# Altium footprint library CM3Board.PcbLib: 127 footprints (part 8 of 8)
Each footprint in its own frame and in the unit in brackets; x right, y up, seen from the top. Pads: shape width x height; smd on the part's side, far side on the other; paste and mask are expansions set on the pad; w line width, h text height; cw(c..) or ccw(c..) is an arc to the next point about the centre after c.
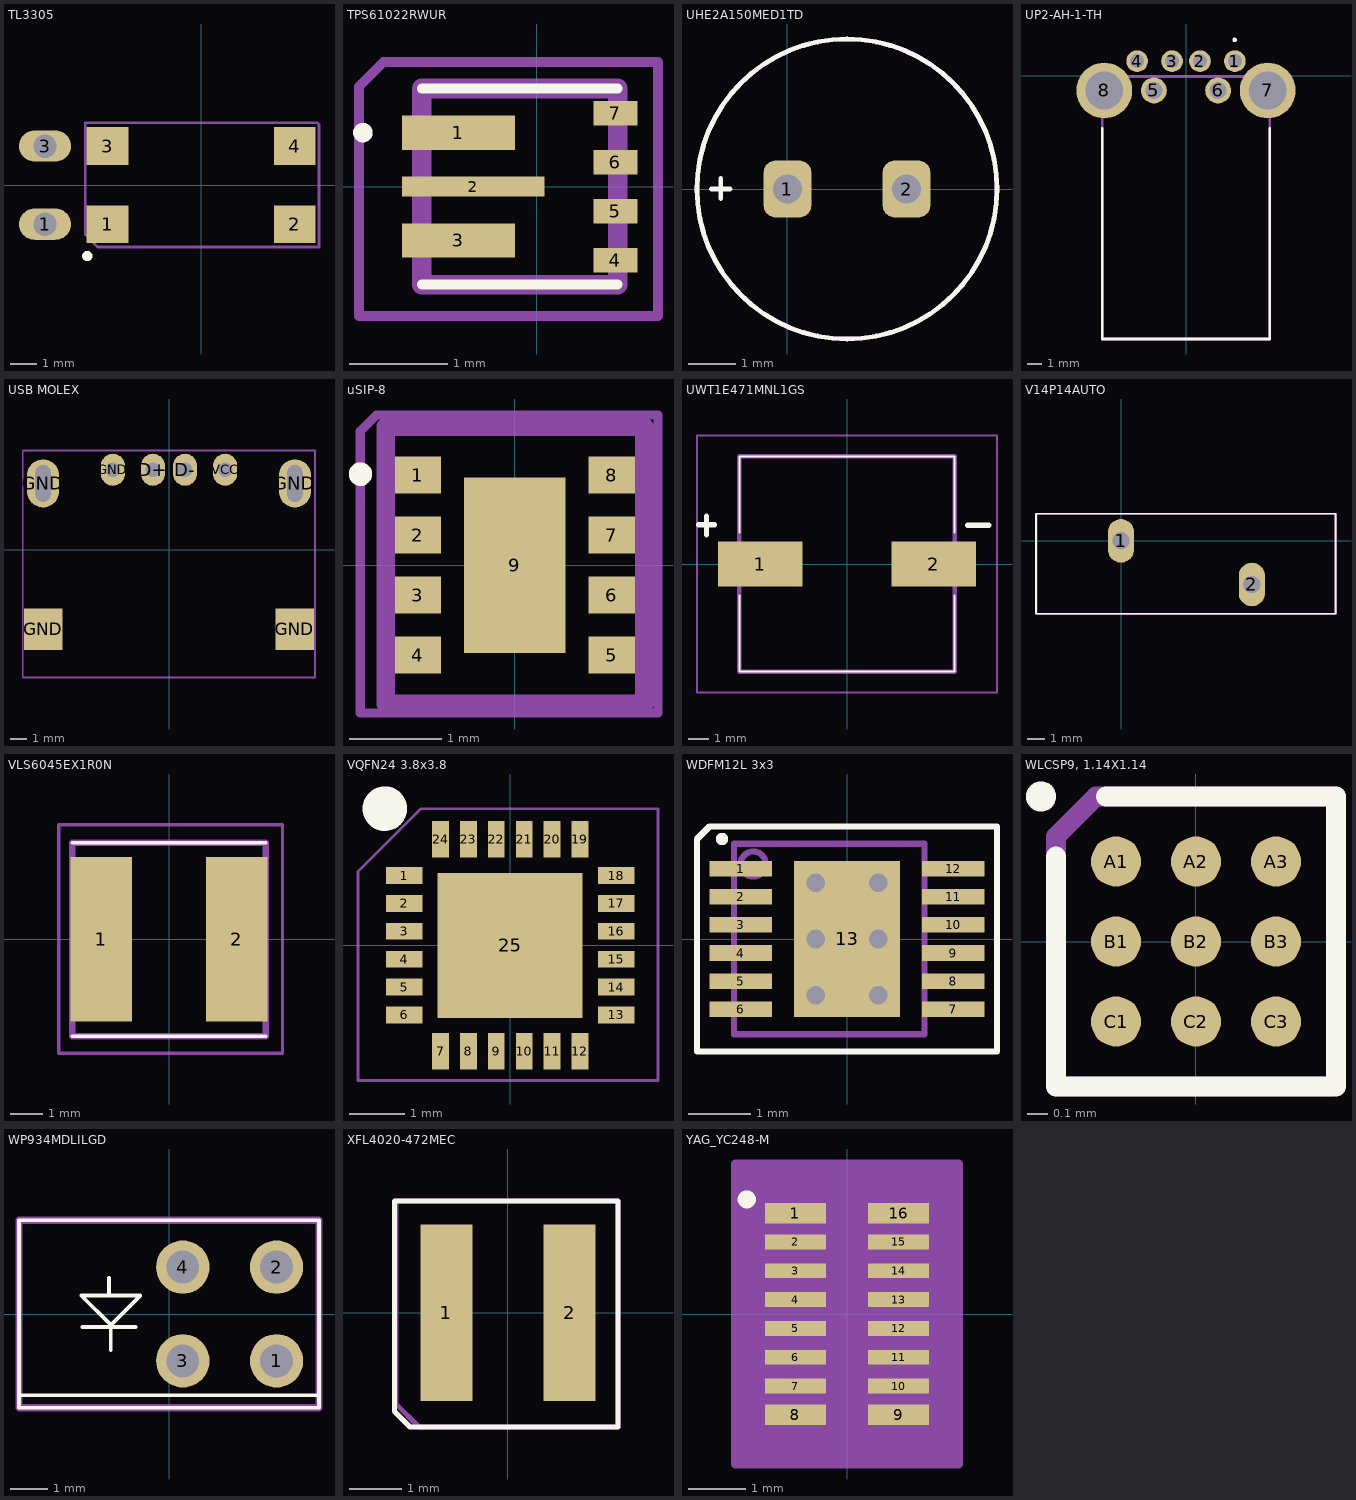
[diagram p7: the footprints below, top view; thin cyan lines are the x and y axes]

## TL3305 [mm] "SWITCH"
pads (6):
  oval 2x1.2 hole 0.9: 1(-6,-1.5) 3(-6,1.5)
  rect 1.6x1.45 smd: 1(-3.6,-1.5) 2(3.6,-1.5) 3(-3.6,1.5) 4(3.6,1.5)
Top Overlay:
  circle w0.254: c-4.375,-2.725 r0.071
Mechanical 29:
  lines w0.1: -4.45,-1.9 -4.45,2.4 4.45,2.4 4.525,2.325 4.525,-2.375 -3.975,-2.375 -4.45,-1.9
  text ".Designator" at -3.1,-0.425 h1.52
3D body: height 10, standoff 7, extent -1.519,-1.344 1.469,1.65
3D body: height 7, standoff 0, extent -3.725,-2.093 3.825,2.144

## TPS61022RWUR [mm]
pads (7):
  rect 1.15x0.35 smd: 1(-0.8,0.55) 3(-0.8,-0.55)
  rect 1.45x0.2 smd: 2(-0.65,0)
  rect 0.45x0.25 smd: 4(0.8,-0.75) 5(0.8,-0.25) 6(0.8,0.25) 7(0.8,0.75)
Top Overlay:
  lines w0.1: -1.175,-1 0.825,-1 ; -1.175,1 0.825,1 ; -1.775,0.5 cw(c-1.775,0.55) -1.775,0.6 cw(c-1.775,0.55) -1.775,0.5
Mechanical 13:
  lines w0.2: -1.175,-1 0.825,-1 0.825,1 -1.175,1 -1.175,-1
Mechanical 29:
  lines w0.1: -1.815,-1.32 -1.815,1.02 -1.565,1.27 1.235,1.27 1.235,-1.32 -1.815,-1.32
  text ".Designator" at 0.575,-1.24 h1
3D body "TPS61022RWUR.stp": height 1.1, standoff 0, extent -1.355,-1 1,1

## UHE2A150MED1TD [mm] "D=6.3"
pads (2):
  rrect50% 1x1.2 hole 0.6: 1(0,0) 2(2.5,0)
Top Overlay:
  circle w0.1: c1.25,0 r3.15
  lines w0.1: -1.6,0 -1.2,0 ; -1.4,-0.2 -1.4,0.225
Mechanical 29:
  circle w0.1: c1.25,0 r3.15
  text ".Designator" at 0.025,-0.4 h1
3D body: height 11, standoff 0, extent -1.925,-3.122 4.375,3.172

## UP2-AH-1-TH [mm]
pads (8):
  round 1.55 hole 1: 1(3.5,1.05) 2(1,1.05) 3(-1,1.05) 4(-3.5,1.05)
  round 1.85 hole 1.2: 5(-2.3,-1.05) 6(2.3,-1.05)
  round 4 hole 2.7: 7(5.85,-1.05) 8(-5.85,-1.05)
Top Overlay:
  circle w0.2: c3.483,2.572 r0.064
  lines w0.2: -6,-3.764 -6,-18.85 6,-18.85 6,-3.764
Mechanical 13:
  lines w0.2: -6,-18.85 -6,-0.05 6,-0.05 6,-18.85 -6,-18.85
Mechanical 29:
  text ".Designator" at -2.09,-11.02 h1
3D body "UP2-AH-1-TH.stp": height 4.15, standoff -2.2, extent -6.3,-18.83 6.3,1.17

## USB MOLEX [mm] "0482580002"
pads (8):
  oval 1.5x2 hole 0.92: D+(-1,4.975) D-(1,4.975) GND(-3.5,4.975) VCC(3.5,4.975)
  rect 2.4x2.6 smd: GND(-7.85,-4.975) GND(7.85,-4.975)
  oval 2x3 hole 0.95 slot 2.3 at 90 deg: GND(-7.85,4.125) GND(7.85,4.125)
Mechanical 29:
  lines w0.1: -9.125,-7.975 -9.125,6.175 9.1,6.175 9.1,-7.975 -9.125,-7.975
  text ".Designator" at -7.3,-5.3 h1.52
3D body "482580002.stp": height 4.27, standoff -2.63, extent -8.55,-8.025 8.55,5.975

## uSIP-8 [mm]
pads (9):
  rect 0.5x0.4 smd: 1(-1.05,0.975) 2(-1.05,0.325) 3(-1.05,-0.325) 4(-1.05,-0.975) 5(1.05,-0.975) 6(1.05,-0.325) 7(1.05,0.325) 8(1.05,0.975)
  rect 1.1x1.9 smd: 9(0,0)
Top Overlay:
  circle w0.2: c-1.672,0.986 r0.027
Mechanical 15:
  lines w0.2: -1.4,-1.5 1.4,-1.5 1.4,1.5 -1.4,1.5 -1.4,-1.5
Mechanical 29:
  lines w0.1: -1.675,-1.6 1.55,-1.6 1.55,1.625 -1.5,1.625 -1.675,1.45 -1.675,-1.6
  text ".Designator" at -0.525,-0.35 h1
3D body "TPS82084SILT.step": height 1.33, standoff 0, extent -1.4,-1.525 1.4,1.475

## UWT1E471MNL1GS [mm]
pads (2):
  rect 4.05x2.15 smd: 1(-4.15,0) 2(4.15,0)
Top Overlay:
  lines w0.1: -5.15,-1.5 -5.15,-5.15 5.15,-5.15 5.15,-1.5 ; -5.15,1.5 -5.15,5.15 5.15,5.15 5.15,1.5
  lines w0.254: -7.1,1.875 -6.35,1.875 ; -6.725,1.4 -6.725,2.3 ; 5.775,1.85 6.775,1.85
Mechanical 13:
  lines w0.2: -5.15,-5.15 -5.15,5.15 5.15,5.15 5.15,-5.15 -5.15,-5.15
Mechanical 29:
  lines w0.1: -7.175,-6.15 7.175,-6.15 7.175,6.15 -7.175,6.15 -7.175,-6.15
  text ".Designator" at -0.55,-0.675 h1

## V14P14AUTO [mm]
pads (2):
  oval 1.5x2.5 hole 1: 1(0,0) 2(7.5,-2.5)
Top Overlay:
  lines w0.1: -4.875,-4.175 -3.5,-4.175 12.3,-4.175 12.3,1.55 -4.875,1.55 -4.875,-4.15
Mechanical 29:
  lines w0.1: -4.85,-4.2 -4.85,1.55 12.325,1.55 12.325,-4.2 -4.85,-4.2
  text ".Designator" at -2.2,-2.1 h1.52
3D body "Varistor 14mm.step": height 18.5, standoff -4.5, extent -4.775,-4.125 12.225,1.475

## VLS6045EX1R0N [mm]
pads (2):
  rect 1.9x5.1 smd: 1(-2.1,0) 2(2.1,0)
Top Overlay:
  lines w0.1: -3,-3 3,-3 ; -3,3 3,3
Mechanical 13:
  lines w0.2: -3,-3 -3,3 3,3 3,-3 -3,-3
Mechanical 29:
  lines w0.1: -3.42,-3.53 -3.42,3.56 3.52,3.56 3.52,-3.53 -3.42,-3.53
  text ".Designator" at -2.98,-0.58 h1
3D body "VLS6045EX-1R0N.stp": height 4.6, standoff 0, extent -2.92,-2.91 3.08,3.09

## VQFN24 3.8x3.8 [mm]
pads (25):
  rect 0.65x0.3 smd: 1(-1.9,1.25) 2(-1.9,0.75) 3(-1.9,0.25) 4(-1.9,-0.25) 5(-1.9,-0.75) 6(-1.9,-1.25) 13(1.9,-1.25) 14(1.9,-0.75) 15(1.9,-0.25) 16(1.9,0.25) 17(1.9,0.75) 18(1.9,1.25)
  rect 0.3x0.65 smd: 7(-1.25,-1.9) 8(-0.75,-1.9) 9(-0.25,-1.9) 10(0.25,-1.9) 11(0.75,-1.9) 12(1.25,-1.9) 19(1.25,1.9) 20(0.75,1.9) 21(0.25,1.9) 22(-0.25,1.9) 23(-0.75,1.9) 24(-1.25,1.9)
  rect 2.6x2.6 smd: 25(0,0)
Top Overlay:
  circle w0.4: c-2.25,2.45 r0.2
Mechanical 29:
  lines w0.05: -2.73,-2.425 2.65,-2.425 2.65,2.45 -1.6,2.45 -2.73,1.32 -2.73,-2.425
  text ".Designator" at -2.58,-0.69 h1
3D body "User Library-QFN 24 4x4.step": height 0.9, standoff 0, extent -2.004,-2.002 2,2.002

## WDFM12L 3x3 [mm]
height 0.8
pads (13):
  rect 1x0.25 smd: 1(-1.7,1.125) 2(-1.7,0.675) 3(-1.7,0.225) 4(-1.7,-0.225) 5(-1.7,-0.675) 6(-1.7,-1.125) 7(1.7,-1.125) 8(1.7,-0.675) 9(1.7,-0.225) 10(1.7,0.225) 11(1.7,0.675) 12(1.7,1.125)
  rect 1.7x2.5 smd: 13(0,0)
via 0.5,-0.9 diameter 0.5 hole 0.3
via -0.5,-0.9 diameter 0.5 hole 0.3
via -0.5,0 diameter 0.5 hole 0.3
via 0.5,0 diameter 0.5 hole 0.3
via 0.5,0.9 diameter 0.5 hole 0.3
via -0.5,0.9 diameter 0.5 hole 0.3
Top Overlay:
  circle w0.1: c-2,1.6 r0.05
  lines w0.1: -2.4,-1.8 2.4,-1.8 2.4,1.8 1.4,1.8 -1.8,1.8 -2.2,1.8 -2.4,1.6 -2.4,-1.8
Mechanical 15:
  lines w0.1: -0.785,0 0.215,0 ; -0.285,-0.5 -0.285,0.5
Mechanical 29:
  circle w0.1: c-1.5,1.2 r0.2
  lines w0.1: -1.81,-1.525 1.24,-1.525 1.24,1.525 -1.81,1.525 -1.81,-1.525
  text ".Designator" at -1.5,-0.7 h1
3D body: height 0.8, standoff 0.05, extent -1.7,-1.45 1.8,1.6

## WLCSP9, 1.14X1.14 [mm]
pads (9):
  round 0.25 smd: A1(-0.4,0.4) A2(0,0.4) A3(0.4,0.4) B1(-0.4,0) B2(0,0) B3(0.4,0) C1(-0.4,-0.4) C2(0,-0.4) C3(0.4,-0.4)
Top Overlay:
  circle w0.1: c-0.775,0.725 r0.025
  lines w0.1: -0.7,0.425 -0.7,-0.725 0.7,-0.725 0.7,0.725 -0.45,0.725
Mechanical 29:
  lines w0.1: -0.7,-0.725 0.675,-0.725 0.7,-0.7 0.7,0.725 -0.5,0.725 -0.7,0.525 -0.7,-0.725
  text ".Designator" at -1,-0.5 h1
3D body: height 0.63, standoff 0.05, extent -0.625,-0.625 0.625,0.625

## WP934MDLILGD [mm]
pads (4):
  round 1.445 hole 0.889: 1(2.915,-1.27) 2(2.915,1.27) 3(0.375,-1.27) 4(0.375,1.27)
Top Overlay:
  lines w0.1: -4.04,-2.2 -3.825,-2.2 4.025,-2.2 ; -2.35,-0.35 -0.9,-0.35 ; -1.65,0.5 -2.375,0.5 -1.575,-0.3 ; -1.625,0.981 -1.625,0.5 -0.775,0.5 -1.575,-0.3 ; -1.575,-0.975 -1.575,-0.3 ; -4.065,-2.54 -4.065,2.54 4.065,2.54 4.065,-2.54 -4.065,-2.54
Mechanical 29:
  lines w0.2: -4.065,-2.54 4.065,-2.54 4.065,2.54 -4.065,2.54 -4.065,-2.54
  text ".Designator" at -0.635,-0.381 h1
3D body "WP934MD_LILGD.stp": height 9, standoff -5, extent -4.065,-2.54 4.065,2.54

## XFL4020-472MEC [mm]
pads (2):
  rect 1x3.4 smd: 1(-1.185,0) 2(1.185,0)
Top Overlay:
  lines w0.1: -2.185,-1.9 -2.185,2.15 2.115,2.15 2.115,-2.2 -1.885,-2.2 -2.185,-1.9
Mechanical 29:
  lines w0.1: -2.16,-1.75 -2.16,2.15 -0.835,2.15 2.115,2.15 2.115,-2.2 -1.66,-2.2 -1.71,-2.2 -2.16,-1.75
  text ".Designator" at -1.135,-0.525 h1
3D body "Coilcraft-XFL4020.step": height 2.1, standoff 0, extent -2.16,-2.175 2.14,2.125

## YAG_YC248-M [mm]
pads (16):
  rect 1.059x0.35 smd paste+0 mask+0: 1(-0.897,1.75) 8(-0.897,-1.75) 9(0.897,-1.75) 16(0.897,1.75)
  rect 1.059x0.256 smd paste+0 mask+0: 2(-0.897,1.25) 3(-0.897,0.75) 4(-0.897,0.25) 5(-0.897,-0.25) 6(-0.897,-0.75) 7(-0.897,-1.25) 10(0.897,-1.25) 11(0.897,-0.75) 12(0.897,-0.25) 13(0.897,0.25) 14(0.897,0.75) 15(0.897,1.25)
Top Overlay:
  circle w0.254: c-1.74,1.99 r0.03
Mechanical 5:
  region: 1.617,-2.286 -1.617,-2.286 -1.617,2.286 1.617,2.286
Mechanical 13:
  lines w0: -0.8,-1.572 ccw(c-0.8,-1.5) -0.8,-1.428 ; -0.8,-1.072 ccw(c-0.8,-1) -0.8,-0.928 ; -0.8,-0.572 ccw(c-0.8,-0.5) -0.8,-0.428 ; -0.8,-0.072 ccw(c-0.8,0) -0.8,0.072 ; -0.8,0.428 ccw(c-0.8,0.5) -0.8,0.572 ; -0.8,0.928 ccw(c-0.8,1) -0.8,1.072 ; -0.8,1.428 ccw(c-0.8,1.5) -0.8,1.572 ; 0.8,-1.572 cw(c0.8,-1.5) 0.8,-1.428 ; 0.8,-1.072 cw(c0.8,-1) 0.8,-0.928 ; 0.8,-0.572 cw(c0.8,-0.5) 0.8,-0.428 ; 0.8,-0.072 cw(c0.8,0) 0.8,0.072 ; 0.8,0.428 cw(c0.8,0.5) 0.8,0.572 ; 0.8,0.928 cw(c0.8,1) 0.8,1.072 ; 0.8,1.428 cw(c0.8,1.5) 0.8,1.572
  lines w0.025: -0.8,-1.572 -0.8,-1.928 -0.8,-2.095 0.8,-2.095 0.8,-1.928 0.8,-1.572 ; -0.8,-1.428 -0.8,-1.072 ; -0.8,-0.928 -0.8,-0.572 ; -0.8,-0.428 -0.8,-0.072 ; -0.8,0.072 -0.8,0.428 ; -0.8,0.572 -0.8,0.928 ; -0.8,1.072 -0.8,1.428 ; -0.8,1.572 -0.8,1.928 -0.8,2.095 0.8,2.095 0.8,1.928 0.8,1.572 ; 0.8,-1.428 0.8,-1.072 ; 0.8,-0.928 0.8,-0.572 ; 0.8,-0.428 0.8,-0.072 ; 0.8,0.072 0.8,0.428 ; 0.8,0.572 0.8,0.928 ; 0.8,1.072 0.8,1.428
  text "*" at -0.864,1.116 h1.27
Mechanical 15:
  region: 0.8,-2.095 -0.8,-2.095 -0.8,2.095 0.8,2.095
  region: 1.934,-2.603 -1.934,-2.603 -1.934,2.603 1.934,2.603
  lines w0.152: -1.934,-2.603 1.934,-2.603 1.934,2.603 -1.934,2.603 -1.934,-2.603
Mechanical 29:
  text ".Designator" at 0.5,2.41 h1
3D body: height 0.25, standoff 0, extent 0,0 0.254,0.254
3D body "User Library-YC248.step": height 0.45, standoff 0, extent -0.79,-1.99 0.81,2.01